# Altium footprint library LukaLIBRARY.PcbLib: 772 footprints (part 25 of 49)
Each footprint in its own frame and in the unit in brackets; x right, y up, seen from the top. Pads: shape width x height; smd on the part's side, far side on the other; paste and mask are expansions set on the pad; w line width, h text height; cw(c..) or ccw(c..) is an arc to the next point about the centre after c.
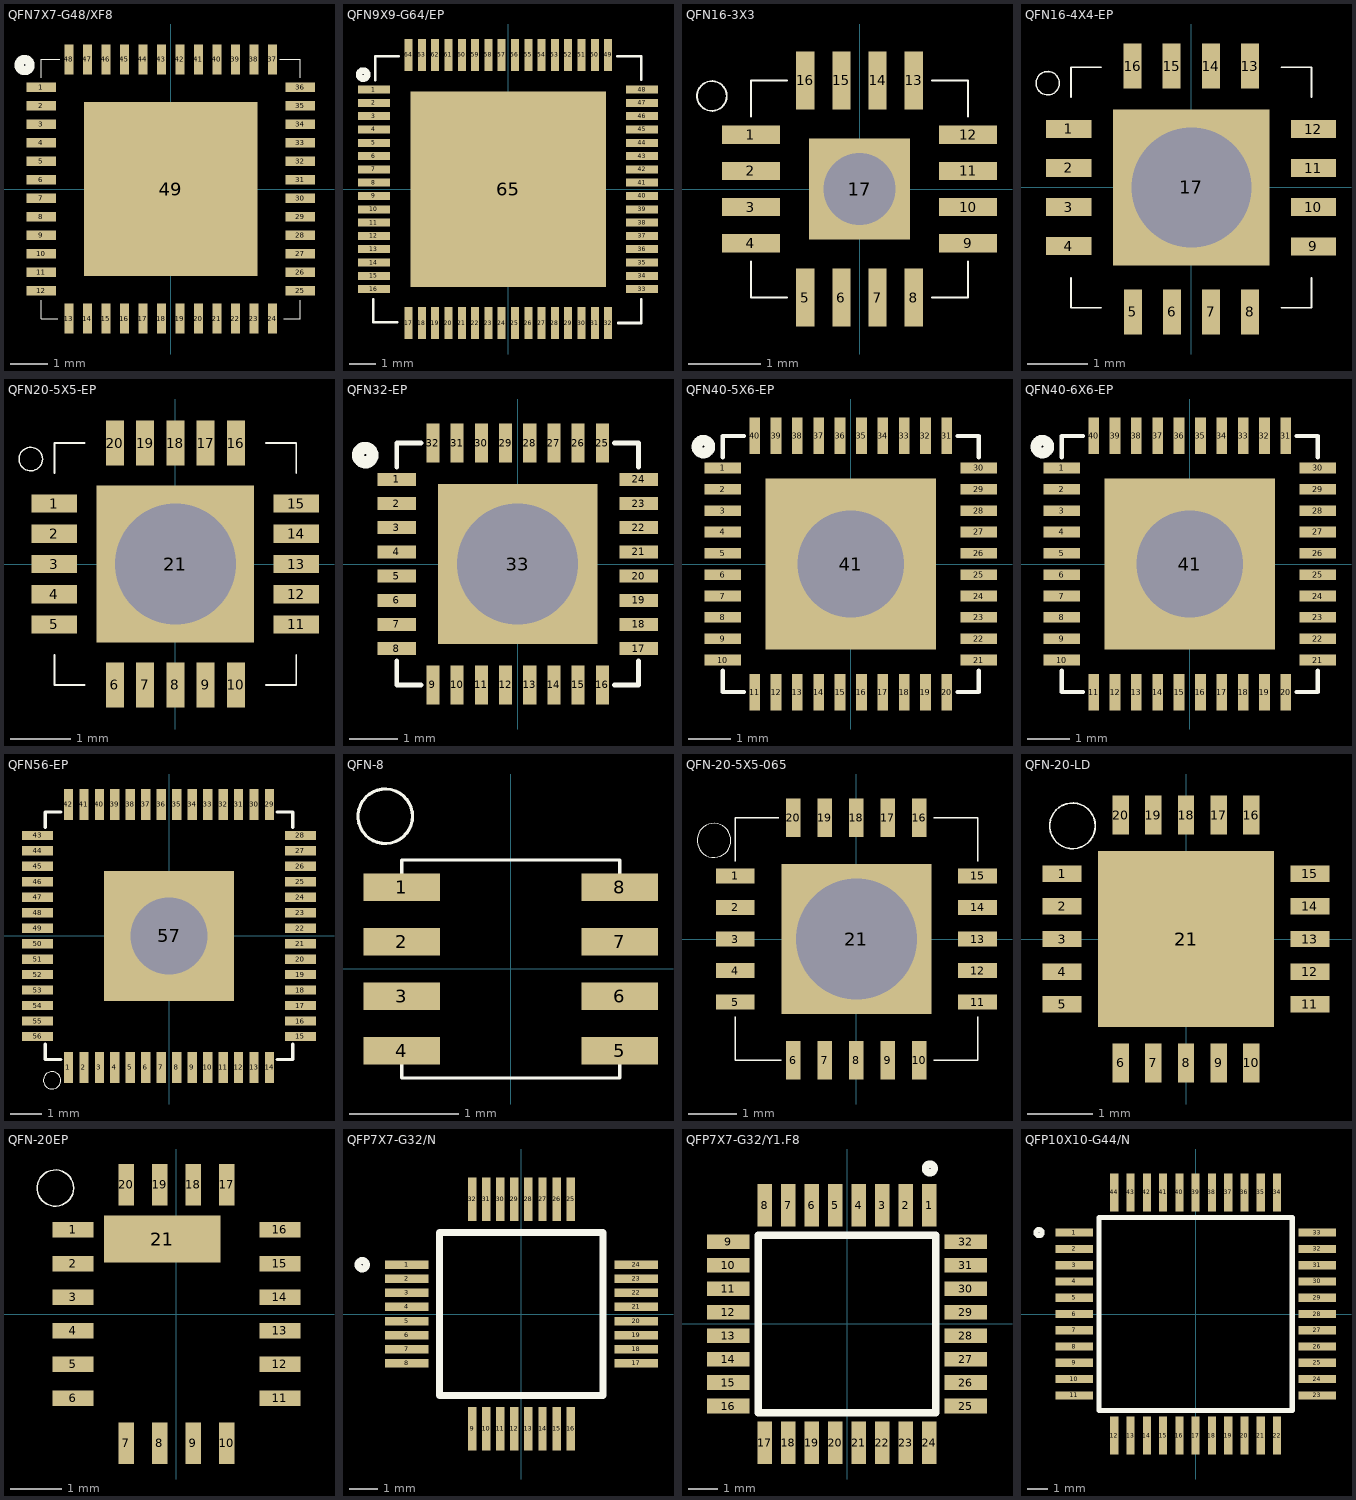
[diagram p24: the footprints below, top view; thin cyan lines are the x and y axes]

## QFN7X7-G48/XF8 [mm]
pads (49):
  rect 0.8x0.254 smd mask-25.4: 1(-3.5,2.75) 2(-3.5,2.25) 3(-3.5,1.75) 4(-3.5,1.25) 5(-3.5,0.75) 6(-3.5,0.25) 7(-3.5,-0.25) 8(-3.5,-0.75) 9(-3.5,-1.25) 10(-3.5,-1.75) 11(-3.5,-2.25) 12(-3.5,-2.75) 25(3.5,-2.75) 26(3.5,-2.25) 27(3.5,-1.75) 28(3.5,-1.25) 29(3.5,-0.75) 30(3.5,-0.25) 31(3.5,0.25) 32(3.5,0.75) 33(3.5,1.25) 34(3.5,1.75) 35(3.5,2.25) 36(3.5,2.75)
  rect 0.254x0.8 smd mask-25.4: 13(-2.75,-3.5) 14(-2.25,-3.5) 15(-1.75,-3.5) 16(-1.25,-3.5) 17(-0.75,-3.5) 18(-0.25,-3.5) 19(0.25,-3.5) 20(0.75,-3.5) 21(1.25,-3.5) 22(1.75,-3.5) 23(2.25,-3.5) 24(2.75,-3.5) 37(2.75,3.5) 38(2.25,3.5) 39(1.75,3.5) 40(1.25,3.5) 41(0.75,3.5) 42(0.25,3.5) 43(-0.25,3.5) 44(-0.75,3.5) 45(-1.25,3.5) 46(-1.75,3.5) 47(-2.25,3.5) 48(-2.75,3.5)
  rect 4.7x4.7 smd mask-25.4: 49(0,0)
Top Overlay:
  circle w0.25: c-3.95,3.35 r0.15
  lines w0.025: -3.5,-3 -3.5,-3.5 -3.05,-3.5 ; -3.5,3 -3.5,3.5 -3,3.5 ; 2.95,3.5 3.5,3.5 3.5,3 ; 3.05,-3.5 3.5,-3.5 3.5,-3
Top Solder:
  drawing of 49 lines, arcs and shapes, not listed

## QFN9X9-G64/EP [mm]
pads (65):
  rect 1.2x0.3 smd mask-25.4: 1(-5.05,3.75) 2(-5.05,3.25) 3(-5.05,2.75) 4(-5.05,2.25) 5(-5.05,1.75) 6(-5.05,1.25) 7(-5.05,0.75) 8(-5.05,0.25) 9(-5.05,-0.25) 10(-5.05,-0.75) 11(-5.05,-1.25) 12(-5.05,-1.75) 13(-5.05,-2.25) 14(-5.05,-2.75) 15(-5.05,-3.25) 16(-5.05,-3.75) 33(5.025,-3.75) 34(5.025,-3.25) 35(5.025,-2.75) 36(5.025,-2.25) 37(5.025,-1.75) 38(5.025,-1.25) 39(5.025,-0.75) 40(5.025,-0.25) 41(5.025,0.25) 42(5.025,0.75) 43(5.025,1.25) 44(5.025,1.75) 45(5.025,2.25) 46(5.025,2.75) 47(5.025,3.25) 48(5.025,3.75)
  rect 0.3x1.2 smd mask-25.4: 17(-3.75,-5.025) 18(-3.25,-5.025) 19(-2.75,-5.025) 20(-2.25,-5.025) 21(-1.75,-5.025) 22(-1.25,-5.025) 23(-0.75,-5.025) 24(-0.25,-5.025) 25(0.25,-5.025) 26(0.75,-5.025) 27(1.25,-5.025) 28(1.75,-5.025) 29(2.25,-5.025) 30(2.75,-5.025) 31(3.25,-5.025) 32(3.75,-5.025) 49(3.75,5.05) 50(3.25,5.05) 51(2.75,5.05) 52(2.25,5.05) 53(1.75,5.05) 54(1.25,5.05) 55(0.75,5.05) 56(0.25,5.05) 57(-0.25,5.05) 58(-0.75,5.05) 59(-1.25,5.05) 60(-1.75,5.05) 61(-2.25,5.05) 62(-2.75,5.05) 63(-3.25,5.05) 64(-3.75,5.05)
  rect 7.35x7.35 smd mask-25.4: 65(0,0)
Top Overlay:
  circle w0.25: c-5.455,4.311 r0.15
  lines w0.1: -5.075,-4.125 -5.075,-5 -4.175,-5 ; -5,4.1 -5,5 -4.125,5 ; 4.1,5 5,5 5,4.125 ; 4.125,-5.025 5,-5.025 5,-4.125
Top Solder:
  drawing of 65 lines, arcs and shapes, not listed

## QFN16-3X3 [mm]
pads (17):
  rect 0.8x0.25 smd mask-25.4: 1(-1.5,0.75) 2(-1.5,0.25) 3(-1.5,-0.25) 4(-1.5,-0.75) 9(1.5,-0.75) 10(1.5,-0.25) 11(1.5,0.25) 12(1.5,0.75)
  rect 0.25x0.8 smd mask-25.4: 5(-0.75,-1.5) 6(-0.25,-1.5) 7(0.25,-1.5) 8(0.75,-1.5) 13(0.75,1.5) 14(0.25,1.5) 15(-0.25,1.5) 16(-0.75,1.5)
  rect 1.4x1.4 hole 1 unplated mask-25.4: 17(0,0)
Top Overlay:
  circle w0.025: c-2.04,1.285 r0.206
  lines w0.025: -1.5,-1 -1.5,-1.5 -1,-1.5 ; -1.5,1 -1.5,1.5 -1,1.5 ; 1,-1.5 1.5,-1.5 1.5,-1 ; 1,1.5 1.5,1.5 1.5,1
Top Solder:
  region: -0.7,-0.7 0.7,-0.7 0.7,0.7 -0.7,0.7
  region: 1.9,-0.4 1.9,-0.1 1.1,-0.1 1.1,-0.4
  region: 1.9,0.1 1.9,0.4 1.1,0.4 1.1,0.1
  region: 1.9,0.6 1.9,0.9 1.1,0.9 1.1,0.6
  region: 0.6,1.1 0.9,1.1 0.9,1.9 0.6,1.9
  region: 0.6,-1.9 0.9,-1.9 0.9,-1.1 0.6,-1.1
  region: 1.9,-0.9 1.9,-0.6 1.1,-0.6 1.1,-0.9
  region: 0.1,1.1 0.4,1.1 0.4,1.9 0.1,1.9
  region: -0.4,1.1 -0.1,1.1 -0.1,1.9 -0.4,1.9
  region: -0.6,1.9 -0.9,1.9 -0.9,1.1 -0.6,1.1
  region: -1.1,-0.4 -1.1,-0.1 -1.9,-0.1 -1.9,-0.4
  region: -1.1,0.1 -1.1,0.4 -1.9,0.4 -1.9,0.1
  region: -1.1,0.6 -1.1,0.9 -1.9,0.9 -1.9,0.6
  region: 0.1,-1.9 0.4,-1.9 0.4,-1.1 0.1,-1.1
  region: -0.4,-1.9 -0.1,-1.9 -0.1,-1.1 -0.4,-1.1
  region: -0.6,-1.1 -0.9,-1.1 -0.9,-1.9 -0.6,-1.9
  region: -1.1,-0.9 -1.1,-0.6 -1.9,-0.6 -1.9,-0.9
Bottom Solder:
  region: -0.7,-0.7 0.7,-0.7 0.7,0.7 -0.7,0.7

## QFN16-4X4-EP [mm]
pads (17):
  rect 0.75x0.3 smd mask-25.4: 1(-2.04,0.975) 2(-2.04,0.325) 3(-2.04,-0.325) 4(-2.04,-0.975) 9(2.03,-0.978) 10(2.03,-0.327) 11(2.03,0.323) 12(2.03,0.972)
  rect 0.3x0.75 smd mask-25.4: 5(-0.972,-2.07) 6(-0.323,-2.07) 7(0.327,-2.07) 8(0.978,-2.07) 13(0.972,2.02) 14(0.323,2.02) 15(-0.327,2.02) 16(-0.978,2.02)
  rect 2.6x2.6 hole 2 unplated mask-25.4: 17(0,0)
Top Overlay:
  circle w0.025: c-2.39,1.735 r0.194
  lines w0.03: -2,-1.5 -2,-2 -1.5,-2 ; -2,1.5 -2,2 -1.5,2 ; 1.5,-2 2,-2 2,-1.5 ; 1.5,2 2,2 2,1.5
Top Solder:
  region: -1.665,-0.475 -1.665,-0.175 -2.415,-0.175 -2.415,-0.475
  region: -1.665,-1.125 -1.665,-0.825 -2.415,-0.825 -2.415,-1.125
  region: -0.473,-2.445 -0.173,-2.445 -0.173,-1.695 -0.473,-1.695
  region: -0.823,-1.695 -1.122,-1.695 -1.122,-2.445 -0.823,-2.445
  region: -1.665,0.825 -1.665,1.125 -2.415,1.125 -2.415,0.825
  region: -1.665,0.175 -1.665,0.475 -2.415,0.475 -2.415,0.175
  region: -0.477,1.645 -0.178,1.645 -0.178,2.395 -0.477,2.395
  region: -0.828,2.395 -1.128,2.395 -1.128,1.645 -0.828,1.645
  region: 0.477,-1.695 0.178,-1.695 0.178,-2.445 0.477,-2.445
  region: 2.405,-1.128 2.405,-0.828 1.655,-0.828 1.655,-1.128
  region: 2.405,-0.477 2.405,-0.178 1.655,-0.178 1.655,-0.477
  region: 0.828,-2.445 1.128,-2.445 1.128,-1.695 0.828,-1.695
  region: 0.473,2.395 0.173,2.395 0.173,1.645 0.473,1.645
  region: 2.405,0.173 2.405,0.473 1.655,0.473 1.655,0.173
  region: 2.405,0.823 2.405,1.122 1.655,1.122 1.655,0.823
  region: 1.122,2.395 0.823,2.395 0.823,1.645 1.122,1.645
  region: -1.3,-1.3 1.3,-1.3 1.3,1.3 -1.3,1.3
Bottom Solder:
  region: -1.5,-1.5 1.5,-1.5 1.5,1.5 -1.5,1.5

## QFN20-5X5-EP [mm]
pads (21):
  rect 0.75x0.3 smd mask-25.4: 1(-2,1) 2(-2,0.5) 3(-2,0) 4(-2,-0.5) 5(-2,-1) 11(2,-1) 12(2,-0.5) 13(2,0) 14(2,0.5) 15(2,1)
  rect 0.3x0.75 smd mask-25.4: 6(-1,-2) 7(-0.5,-2) 8(0,-2) 9(0.5,-2) 10(1,-2) 16(1,2) 17(0.5,2) 18(0,2) 19(-0.5,2) 20(-1,2)
  rect 2.6x2.6 hole 2 unplated mask-25.4: 21(0,0)
Top Overlay:
  circle w0.025: c-2.39,1.735 r0.194
  lines w0.03: -2,-1.5 -2,-2 -1.5,-2 ; -2,1.5 -2,2 -1.5,2 ; 1.5,-2 2,-2 2,-1.5 ; 1.5,2 2,2 2,1.5
Top Solder:
  region: -1.625,-0.65 -1.625,-0.35 -2.375,-0.35 -2.375,-0.65
  region: -1.625,-1.15 -1.625,-0.85 -2.375,-0.85 -2.375,-1.15
  region: -1.15,-2.375 -0.85,-2.375 -0.85,-1.625 -1.15,-1.625
  region: -0.35,-1.625 -0.65,-1.625 -0.65,-2.375 -0.35,-2.375
  region: -1.625,0.85 -1.625,1.15 -2.375,1.15 -2.375,0.85
  region: -1.625,0.35 -1.625,0.65 -2.375,0.65 -2.375,0.35
  region: -0.35,2.375 -0.65,2.375 -0.65,1.625 -0.35,1.625
  region: -0.85,2.375 -1.15,2.375 -1.15,1.625 -0.85,1.625
  region: 0.65,-1.625 0.35,-1.625 0.35,-2.375 0.65,-2.375
  region: 1.15,-1.625 0.85,-1.625 0.85,-2.375 1.15,-2.375
  region: 2.375,-1.15 2.375,-0.85 1.625,-0.85 1.625,-1.15
  region: 2.375,-0.65 2.375,-0.35 1.625,-0.35 1.625,-0.65
  region: 1.625,0.65 1.625,0.35 2.375,0.35 2.375,0.65
  region: 2.375,0.85 2.375,1.15 1.625,1.15 1.625,0.85
  region: 1.15,2.375 0.85,2.375 0.85,1.625 1.15,1.625
  region: 0.65,2.375 0.35,2.375 0.35,1.625 0.65,1.625
  region: -1.625,-0.15 -1.625,0.15 -2.375,0.15 -2.375,-0.15
  region: 1.625,0.15 1.625,-0.15 2.375,-0.15 2.375,0.15
  region: -0.15,-2.375 0.15,-2.375 0.15,-1.625 -0.15,-1.625
  region: 0.15,2.375 -0.15,2.375 -0.15,1.625 0.15,1.625
  region: -1.3,-1.3 1.3,-1.3 1.3,1.3 -1.3,1.3
Bottom Solder:
  region: -1.5,-1.5 1.5,-1.5 1.5,1.5 -1.5,1.5

## QFN32-EP [mm]
pads (33):
  rect 0.8x0.27 smd: 1(-2.5,1.75) 2(-2.5,1.25) 3(-2.5,0.75) 4(-2.5,0.25) 5(-2.5,-0.25) 6(-2.5,-0.75) 7(-2.5,-1.25) 8(-2.5,-1.75) 17(2.5,-1.75) 18(2.5,-1.25) 19(2.5,-0.75) 20(2.5,-0.25) 21(2.5,0.25) 22(2.5,0.75) 23(2.5,1.25) 24(2.5,1.75)
  rect 0.27x0.8 smd: 9(-1.75,-2.5) 10(-1.25,-2.5) 11(-0.75,-2.5) 12(-0.25,-2.5) 13(0.25,-2.5) 14(0.75,-2.5) 15(1.25,-2.5) 16(1.75,-2.5) 25(1.75,2.5) 26(1.25,2.5) 27(0.75,2.5) 28(0.25,2.5) 29(-0.25,2.5) 30(-0.75,2.5) 31(-1.25,2.5) 32(-1.75,2.5)
  rect 3.3x3.3 on Top hole 2.5 unplated: 33(0,0)
Top Overlay:
  circle w0.25: c-3.15,2.25 r0.15
  lines w0.1: -2.5,-2 -2.5,-2.5 -2,-2.5 ; -2.5,2 -2.5,2.5 -2,2.5 ; 2,-2.5 2.5,-2.5 2.5,-2 ; 2,2.5 2.5,2.5 2.5,2

## QFN40-5X6-EP [mm]
pads (41):
  rect 0.85x0.25 smd: 1(-3,2.25) 2(-3,1.75) 3(-3,1.25) 4(-3,0.75) 5(-3,0.25) 6(-3,-0.25) 7(-3,-0.75) 8(-3,-1.25) 9(-3,-1.75) 10(-3,-2.25) 21(3,-2.25) 22(3,-1.75) 23(3,-1.25) 24(3,-0.75) 25(3,-0.25) 26(3,0.25) 27(3,0.75) 28(3,1.25) 29(3,1.75) 30(3,2.25)
  rect 0.25x0.85 smd: 11(-2.25,-3) 12(-1.75,-3) 13(-1.25,-3) 14(-0.75,-3) 15(-0.25,-3) 16(0.25,-3) 17(0.75,-3) 18(1.25,-3) 19(1.75,-3) 20(2.25,-3) 31(2.25,3) 32(1.75,3) 33(1.25,3) 34(0.75,3) 35(0.25,3) 36(-0.25,3) 37(-0.75,3) 38(-1.25,3) 39(-1.75,3) 40(-2.25,3)
  rect 4x4 hole 2.5 unplated mask-25.4: 41(0,0)
Top Overlay:
  circle w0.25: c-3.45,2.75 r0.15
  lines w0.1: -3,-2.5 -3,-3 -2.5,-3 ; -3,2.5 -3,3 -2.5,3 ; 2.5,-3 3,-3 3,-2.5 ; 2.5,3 3,3 3,2.5
Top Solder:
  region: 2,-2 2,2 -2,2 -2,-2
Bottom Solder:
  region: -2.01,0 -1.971,-0.392 -1.857,-0.769 -1.671,-1.117 -1.421,-1.421 -1.117,-1.671 -0.769,-1.857 -0.392,-1.971 0,-2.01 0.392,-1.971 0.769,-1.857 1.117,-1.671 1.421,-1.421 1.671,-1.117 1.857,-0.769 1.971,-0.392 2.01,0 1.971,0.392 1.857,0.769 1.671,1.117 1.421,1.421 1.117,1.671 0.769,1.857 0.392,1.971 0,2.01 -0.392,1.971 -0.769,1.857 -1.117,1.671 -1.421,1.421 -1.671,1.117 -1.857,0.769 -1.971,0.392

## QFN40-6X6-EP [mm]
pads (41):
  rect 0.85x0.25 smd: 1(-3,2.25) 2(-3,1.75) 3(-3,1.25) 4(-3,0.75) 5(-3,0.25) 6(-3,-0.25) 7(-3,-0.75) 8(-3,-1.25) 9(-3,-1.75) 10(-3,-2.25) 21(3,-2.25) 22(3,-1.75) 23(3,-1.25) 24(3,-0.75) 25(3,-0.25) 26(3,0.25) 27(3,0.75) 28(3,1.25) 29(3,1.75) 30(3,2.25)
  rect 0.25x0.85 smd: 11(-2.25,-3) 12(-1.75,-3) 13(-1.25,-3) 14(-0.75,-3) 15(-0.25,-3) 16(0.25,-3) 17(0.75,-3) 18(1.25,-3) 19(1.75,-3) 20(2.25,-3) 31(2.25,3) 32(1.75,3) 33(1.25,3) 34(0.75,3) 35(0.25,3) 36(-0.25,3) 37(-0.75,3) 38(-1.25,3) 39(-1.75,3) 40(-2.25,3)
  rect 4x4 hole 2.5 unplated mask-25.4: 41(0,0)
Top Overlay:
  circle w0.25: c-3.45,2.75 r0.15
  lines w0.1: -3,-2.5 -3,-3 -2.5,-3 ; -3,2.5 -3,3 -2.5,3 ; 2.5,-3 3,-3 3,-2.5 ; 2.5,3 3,3 3,2.5
Top Solder:
  region: 2,-2 2,2 -2,2 -2,-2
Bottom Solder:
  region: -2.01,0 -1.971,-0.392 -1.857,-0.769 -1.671,-1.117 -1.421,-1.421 -1.117,-1.671 -0.769,-1.857 -0.392,-1.971 0,-2.01 0.392,-1.971 0.769,-1.857 1.117,-1.671 1.421,-1.421 1.671,-1.117 1.857,-0.769 1.971,-0.392 2.01,0 1.971,0.392 1.857,0.769 1.671,1.117 1.421,1.421 1.117,1.671 0.769,1.857 0.392,1.971 0,2.01 -0.392,1.971 -0.769,1.857 -1.117,1.671 -1.421,1.421 -1.671,1.117 -1.857,0.769 -1.971,0.392

## QFN56-EP [mm]
pads (57):
  rect 0.3x1 smd mask-25.4: 1(-3.25,-4.25) 2(-2.75,-4.25) 3(-2.25,-4.25) 4(-1.75,-4.25) 5(-1.25,-4.25) 6(-0.75,-4.25) 7(-0.25,-4.25) 8(0.25,-4.25) 9(0.75,-4.25) 10(1.25,-4.25) 11(1.75,-4.25) 12(2.25,-4.25) 13(2.75,-4.25) 14(3.25,-4.25) 29(3.25,4.25) 30(2.75,4.25) 31(2.25,4.25) 32(1.75,4.25) 33(1.25,4.25) 34(0.75,4.25) 35(0.25,4.25) 36(-0.25,4.25) 37(-0.75,4.25) 38(-1.25,4.25) 39(-1.75,4.25) 40(-2.25,4.25) 41(-2.75,4.25) 42(-3.25,4.25)
  rect 1x0.3 smd mask-25.4: 15(4.25,-3.25) 16(4.25,-2.75) 17(4.25,-2.25) 18(4.25,-1.75) 19(4.25,-1.25) 20(4.25,-0.75) 21(4.25,-0.25) 22(4.25,0.25) 23(4.25,0.75) 24(4.25,1.25) 25(4.25,1.75) 26(4.25,2.25) 27(4.25,2.75) 28(4.25,3.25) 43(-4.25,3.25) 44(-4.25,2.75) 45(-4.25,2.25) 46(-4.25,1.75) 47(-4.25,1.25) 48(-4.25,0.75) 49(-4.25,0.25) 50(-4.25,-0.25) 51(-4.25,-0.75) 52(-4.25,-1.25) 53(-4.25,-1.75) 54(-4.25,-2.25) 55(-4.25,-2.75) 56(-4.25,-3.25)
  rect 4.2x4.2 hole 2.5 unplated mask-25.4: 57(0,0)
Top Overlay:
  circle w0.025: c-3.78,-4.67 r0.278
  lines w0.1: -4,-3.5 -4,-4 -3.5,-4 ; -4,3.5 -4,4 -3.5,4 ; 3.5,-4 4,-4 4,-3.5 ; 3.5,4 4,4 4,3.5
Top Solder:
  drawing of 57 lines, arcs and shapes, not listed
Bottom Solder:
  region: 2.1,-2.1 2.1,2.1 -2.1,2.1 -2.1,-2.1

## QFN-8 [mm]
pads (8):
  rect 0.7x0.25 smd mask-25.4: 1(-1,0.75) 2(-1,0.25) 3(-1,-0.25) 4(-1,-0.75) 5(1,-0.75) 6(1,-0.25) 7(1,0.25) 8(1,0.75)
Top Overlay:
  circle w0.03: c-1.15,1.4 r0.25
  lines w0.03: -1,-0.85 -1,-1 1,-1 1,-0.85 ; -1,0.85 -1,1 1,1 1,0.85
Top Solder:
  region: -1.35,0.125 -0.65,0.125 -0.65,0.375 -1.35,0.375
  region: -1.35,-0.375 -0.65,-0.375 -0.65,-0.125 -1.35,-0.125
  region: -1.35,-0.875 -0.65,-0.875 -0.65,-0.625 -1.35,-0.625
  region: -1.35,0.625 -0.65,0.625 -0.65,0.875 -1.35,0.875
  region: 0.65,-0.875 1.35,-0.875 1.35,-0.625 0.65,-0.625
  region: 0.65,-0.375 1.35,-0.375 1.35,-0.125 0.65,-0.125
  region: 0.65,0.125 1.35,0.125 1.35,0.375 0.65,0.375
  region: 0.65,0.625 1.35,0.625 1.35,0.875 0.65,0.875

## QFN-20-5X5-065 [mm]
pads (21):
  rect 0.8x0.3 smd mask-25.4: 1(-2.5,1.3) 2(-2.5,0.65) 3(-2.5,0) 4(-2.5,-0.65) 5(-2.5,-1.3) 11(2.5,-1.3) 12(2.5,-0.65) 13(2.5,0) 14(2.5,0.65) 15(2.5,1.3)
  rect 0.3x0.8 smd mask-25.4: 6(-1.3,-2.5) 7(-0.65,-2.5) 8(0,-2.5) 9(0.65,-2.5) 10(1.3,-2.5) 16(1.3,2.5) 17(0.65,2.5) 18(0,2.5) 19(-0.65,2.5) 20(-1.3,2.5)
  rect 3.1x3.1 hole 2.5 unplated mask-25.4: 21(0,0)
Top Overlay:
  circle w0.025: c-2.94,2.035 r0.35
  lines w0.03: -2.5,-1.6 -2.5,-2.5 -1.55,-2.5 ; -2.5,1.6 -2.5,2.5 -1.6,2.5 ; 1.6,-2.5 2.5,-2.5 2.5,-1.6 ; 1.6,2.5 2.5,2.5 2.5,1.6
Top Solder:
  region: -0.8,-2.9 -0.5,-2.9 -0.5,-2.1 -0.8,-2.1
  region: -1.15,-2.1 -1.45,-2.1 -1.45,-2.9 -1.15,-2.9
  region: -0.15,-2.9 0.15,-2.9 0.15,-2.1 -0.15,-2.1
  region: -2.1,-0.15 -2.1,0.15 -2.9,0.15 -2.9,-0.15
  region: -2.1,-0.8 -2.1,-0.5 -2.9,-0.5 -2.9,-0.8
  region: -2.1,-1.45 -2.1,-1.15 -2.9,-1.15 -2.9,-1.45
  region: -2.1,1.15 -2.1,1.45 -2.9,1.45 -2.9,1.15
  region: -1.45,2.1 -1.15,2.1 -1.15,2.9 -1.45,2.9
  region: -0.8,2.1 -0.5,2.1 -0.5,2.9 -0.8,2.9
  region: -0.15,2.1 0.15,2.1 0.15,2.9 -0.15,2.9
  region: 1.15,-2.9 1.45,-2.9 1.45,-2.1 1.15,-2.1
  region: 2.1,0.15 2.1,-0.15 2.9,-0.15 2.9,0.15
  region: 2.1,-0.5 2.1,-0.8 2.9,-0.8 2.9,-0.5
  region: 2.1,-1.15 2.1,-1.45 2.9,-1.45 2.9,-1.15
  region: 2.1,1.45 2.1,1.15 2.9,1.15 2.9,1.45
  region: 1.15,2.1 1.45,2.1 1.45,2.9 1.15,2.9
  region: -2.1,0.5 -2.1,0.8 -2.9,0.8 -2.9,0.5
  region: 2.1,0.8 2.1,0.5 2.9,0.5 2.9,0.8
  region: 0.5,-2.9 0.8,-2.9 0.8,-2.1 0.5,-2.1
  region: 0.5,2.1 0.8,2.1 0.8,2.9 0.5,2.9
  region: -1.35,-1.35 1.35,-1.35 1.35,1.35 -1.35,1.35
Bottom Solder:
  region: -1.55,-1.55 1.55,-1.55 1.55,1.55 -1.55,1.55

## QFN-20-LD [mm]
pads (21):
  rect 0.6x0.25 smd mask-25.4: 1(-1.9,1) 2(-1.9,0.5) 3(-1.9,0) 4(-1.9,-0.5) 5(-1.9,-1) 11(1.9,-1) 12(1.9,-0.5) 13(1.9,0) 14(1.9,0.5) 15(1.9,1)
  rect 0.25x0.6 smd mask-25.4: 6(-1,-1.9) 7(-0.5,-1.9) 8(0,-1.9) 9(0.5,-1.9) 10(1,-1.9) 16(1,1.9) 17(0.5,1.9) 18(0,1.9) 19(-0.5,1.9) 20(-1,1.9)
  rect 2.7x2.7 smd mask-25.4: 21(0,0)
Top Overlay:
  circle w0.025: c-1.74,1.735 r0.35
Top Solder:
  region: -0.85,-1.5 -1.15,-1.5 -1.15,-2.3 -0.85,-2.3
  region: -0.65,-2.3 -0.35,-2.3 -0.35,-1.5 -0.65,-1.5
  region: -0.15,-2.3 0.15,-2.3 0.15,-1.5 -0.15,-1.5
  region: 0.35,-2.3 0.65,-2.3 0.65,-1.5 0.35,-1.5
  region: 0.85,-2.3 1.15,-2.3 1.15,-1.5 0.85,-1.5
  region: 1.5,-0.85 1.5,-1.15 2.3,-1.15 2.3,-0.85
  region: -1.5,-1.15 -1.5,-0.85 -2.3,-0.85 -2.3,-1.15
  region: 0.85,1.5 1.15,1.5 1.15,2.3 0.85,2.3
  region: 0.35,1.5 0.65,1.5 0.65,2.3 0.35,2.3
  region: -0.15,1.5 0.15,1.5 0.15,2.3 -0.15,2.3
  region: -0.65,1.5 -0.35,1.5 -0.35,2.3 -0.65,2.3
  region: -1.15,1.5 -0.85,1.5 -0.85,2.3 -1.15,2.3
  region: 1.5,0.15 1.5,-0.15 2.3,-0.15 2.3,0.15
  region: 1.5,0.65 1.5,0.35 2.3,0.35 2.3,0.65
  region: 1.5,1.15 1.5,0.85 2.3,0.85 2.3,1.15
  region: -1.5,0.85 -1.5,1.15 -2.3,1.15 -2.3,0.85
  region: -1.5,0.35 -1.5,0.65 -2.3,0.65 -2.3,0.35
  region: -1.5,-0.15 -1.5,0.15 -2.3,0.15 -2.3,-0.15
  region: 1.5,-0.35 1.5,-0.65 2.3,-0.65 2.3,-0.35
  region: -1.5,-0.65 -1.5,-0.35 -2.3,-0.35 -2.3,-0.65
  region: -1.35,-1.35 1.35,-1.35 1.35,1.35 -1.35,1.35

## QFN-20EP [mm]
pads (21):
  rect 0.8x0.3 smd mask-25.4: 1(-2,1.625) 2(-2,0.975) 3(-2,0.325) 4(-2,-0.325) 5(-2,-0.975) 6(-2,-1.625) 11(2,-1.625) 12(2,-0.975) 13(2,-0.325) 14(2,0.325) 15(2,0.975) 16(2,1.625)
  rect 0.3x0.8 smd mask-25.4: 7(-0.975,-2.5) 8(-0.325,-2.5) 9(0.325,-2.5) 10(0.975,-2.5) 17(0.975,2.5) 18(0.325,2.5) 19(-0.325,2.5) 20(-0.975,2.5)
  rect 2.25x0.9 smd mask-25.4: 21(-0.275,1.45)
Top Overlay:
  circle w0.025: c-2.34,2.435 r0.35
Top Solder:
  region: -1.125,-2.9 -0.825,-2.9 -0.825,-2.1 -1.125,-2.1
  region: -1.6,-1.775 -1.6,-1.475 -2.4,-1.475 -2.4,-1.775
  region: -1.6,-1.125 -1.6,-0.825 -2.4,-0.825 -2.4,-1.125
  region: -1.6,-0.475 -1.6,-0.175 -2.4,-0.175 -2.4,-0.475
  region: -1.125,2.1 -0.825,2.1 -0.825,2.9 -1.125,2.9
  region: -1.6,0.825 -1.6,1.125 -2.4,1.125 -2.4,0.825
  region: -1.6,1.475 -1.6,1.775 -2.4,1.775 -2.4,1.475
  region: 0.175,-2.9 0.475,-2.9 0.475,-2.1 0.175,-2.1
  region: 1.6,-1.475 1.6,-1.775 2.4,-1.775 2.4,-1.475
  region: 1.6,-0.825 1.6,-1.125 2.4,-1.125 2.4,-0.825
  region: 1.6,-0.175 1.6,-0.475 2.4,-0.475 2.4,-0.175
  region: 0.825,-2.9 1.125,-2.9 1.125,-2.1 0.825,-2.1
  region: 0.175,2.1 0.475,2.1 0.475,2.9 0.175,2.9
  region: 0.825,2.1 1.125,2.1 1.125,2.9 0.825,2.9
  region: 1.6,1.125 1.6,0.825 2.4,0.825 2.4,1.125
  region: 1.6,1.775 1.6,1.475 2.4,1.475 2.4,1.775
  region: -1.6,0.175 -1.6,0.475 -2.4,0.475 -2.4,0.175
  region: 1.6,0.475 1.6,0.175 2.4,0.175 2.4,0.475
  region: -0.475,-2.9 -0.175,-2.9 -0.175,-2.1 -0.475,-2.1
  region: -0.475,2.1 -0.175,2.1 -0.175,2.9 -0.475,2.9
  region: -1.4,1 0.85,1 0.85,1.9 -1.4,1.9

## QFP7X7-G32/N [mm]
pads (32):
  rect 1.55x0.3 smd: 1(-4.075,1.75) 2(-4.075,1.25) 3(-4.075,0.75) 4(-4.075,0.25) 5(-4.075,-0.25) 6(-4.075,-0.75) 7(-4.075,-1.25) 8(-4.075,-1.75) 17(4.075,-1.75) 18(4.075,-1.25) 19(4.075,-0.75) 20(4.075,-0.25) 21(4.075,0.25) 22(4.075,0.75) 23(4.075,1.25) 24(4.075,1.75)
  rect 0.3x1.55 smd: 9(-1.75,-4.075) 10(-1.25,-4.075) 11(-0.75,-4.075) 12(-0.25,-4.075) 13(0.25,-4.075) 14(0.75,-4.075) 15(1.25,-4.075) 16(1.75,-4.075) 25(1.75,4.075) 26(1.25,4.075) 27(0.75,4.075) 28(0.25,4.075) 29(-0.25,4.075) 30(-0.75,4.075) 31(-1.25,4.075) 32(-1.75,4.075)
Top Overlay:
  circle w0.25: c-5.65,1.75 r0.15
  lines w0.25: -2.9,-2.9 2.9,-2.9 2.9,2.9 -2.9,2.9 -2.9,-2.9

## QFP7X7-G32/Y1.F8 [mm]
pads (32):
  rect 0.5x1.45 smd: 1(2.8,4.05) 2(2,4.05) 3(1.2,4.05) 4(0.4,4.05) 5(-0.4,4.05) 6(-1.2,4.05) 7(-2,4.05) 8(-2.8,4.05) 17(-2.8,-4.05) 18(-2,-4.05) 19(-1.2,-4.05) 20(-0.4,-4.05) 21(0.4,-4.05) 22(1.2,-4.05) 23(2,-4.05) 24(2.8,-4.05)
  rect 1.45x0.5 smd: 9(-4.05,2.8) 10(-4.05,2) 11(-4.05,1.2) 12(-4.05,0.4) 13(-4.05,-0.4) 14(-4.05,-1.2) 15(-4.05,-2) 16(-4.05,-2.8) 25(4.05,-2.8) 26(4.05,-2) 27(4.05,-1.2) 28(4.05,-0.4) 29(4.05,0.4) 30(4.05,1.2) 31(4.05,2) 32(4.05,2.8)
Top Overlay:
  circle w0.25: c2.825,5.3 r0.15
  lines w0.25: -3.025,-3.025 3.025,-3.025 3.025,3.025 -3.025,3.025 -3.025,-3.025

## QFP10X10-G44/N [mm]
pads (44):
  rect 1.85x0.4 smd mask-25.4: 1(-5.975,4) 2(-5.975,3.2) 3(-5.975,2.4) 4(-5.975,1.6) 5(-5.975,0.8) 6(-5.975,0) 7(-5.975,-0.8) 8(-5.975,-1.6) 9(-5.975,-2.4) 10(-5.975,-3.2) 11(-5.975,-4) 23(5.975,-4) 24(5.975,-3.2) 25(5.975,-2.4) 26(5.975,-1.6) 27(5.975,-0.8) 28(5.975,0) 29(5.975,0.8) 30(5.975,1.6) 31(5.975,2.4) 32(5.975,3.2) 33(5.975,4)
  rect 0.4x1.85 smd mask-25.4: 12(-4,-5.975) 13(-3.2,-5.975) 14(-2.4,-5.975) 15(-1.6,-5.975) 16(-0.8,-5.975) 17(0,-5.975) 18(0.8,-5.975) 19(1.6,-5.975) 20(2.4,-5.975) 21(3.2,-5.975) 22(4,-5.975) 34(4,5.975) 35(3.2,5.975) 36(2.4,5.975) 37(1.6,5.975) 38(0.8,5.975) 39(0,5.975) 40(-0.8,5.975) 41(-1.6,5.975) 42(-2.4,5.975) 43(-3.2,5.975) 44(-4,5.975)
Top Overlay:
  circle w0.25: c-7.7,4 r0.15
  lines w0.25: -4.75,-4.75 -4.75,4.75 4.75,4.75 4.75,-4.75 -4.75,-4.75
Top Solder:
  drawing of 44 lines, arcs and shapes, not listed